# Altium footprint library IC_STD.PcbLib: 32 footprints (part 1 of 2)
Each footprint in its own frame and in the unit in brackets; x right, y up, seen from the top. Pads: shape width x height; smd on the part's side, far side on the other; paste and mask are expansions set on the pad; w line width, h text height; cw(c..) or ccw(c..) is an arc to the next point about the centre after c.
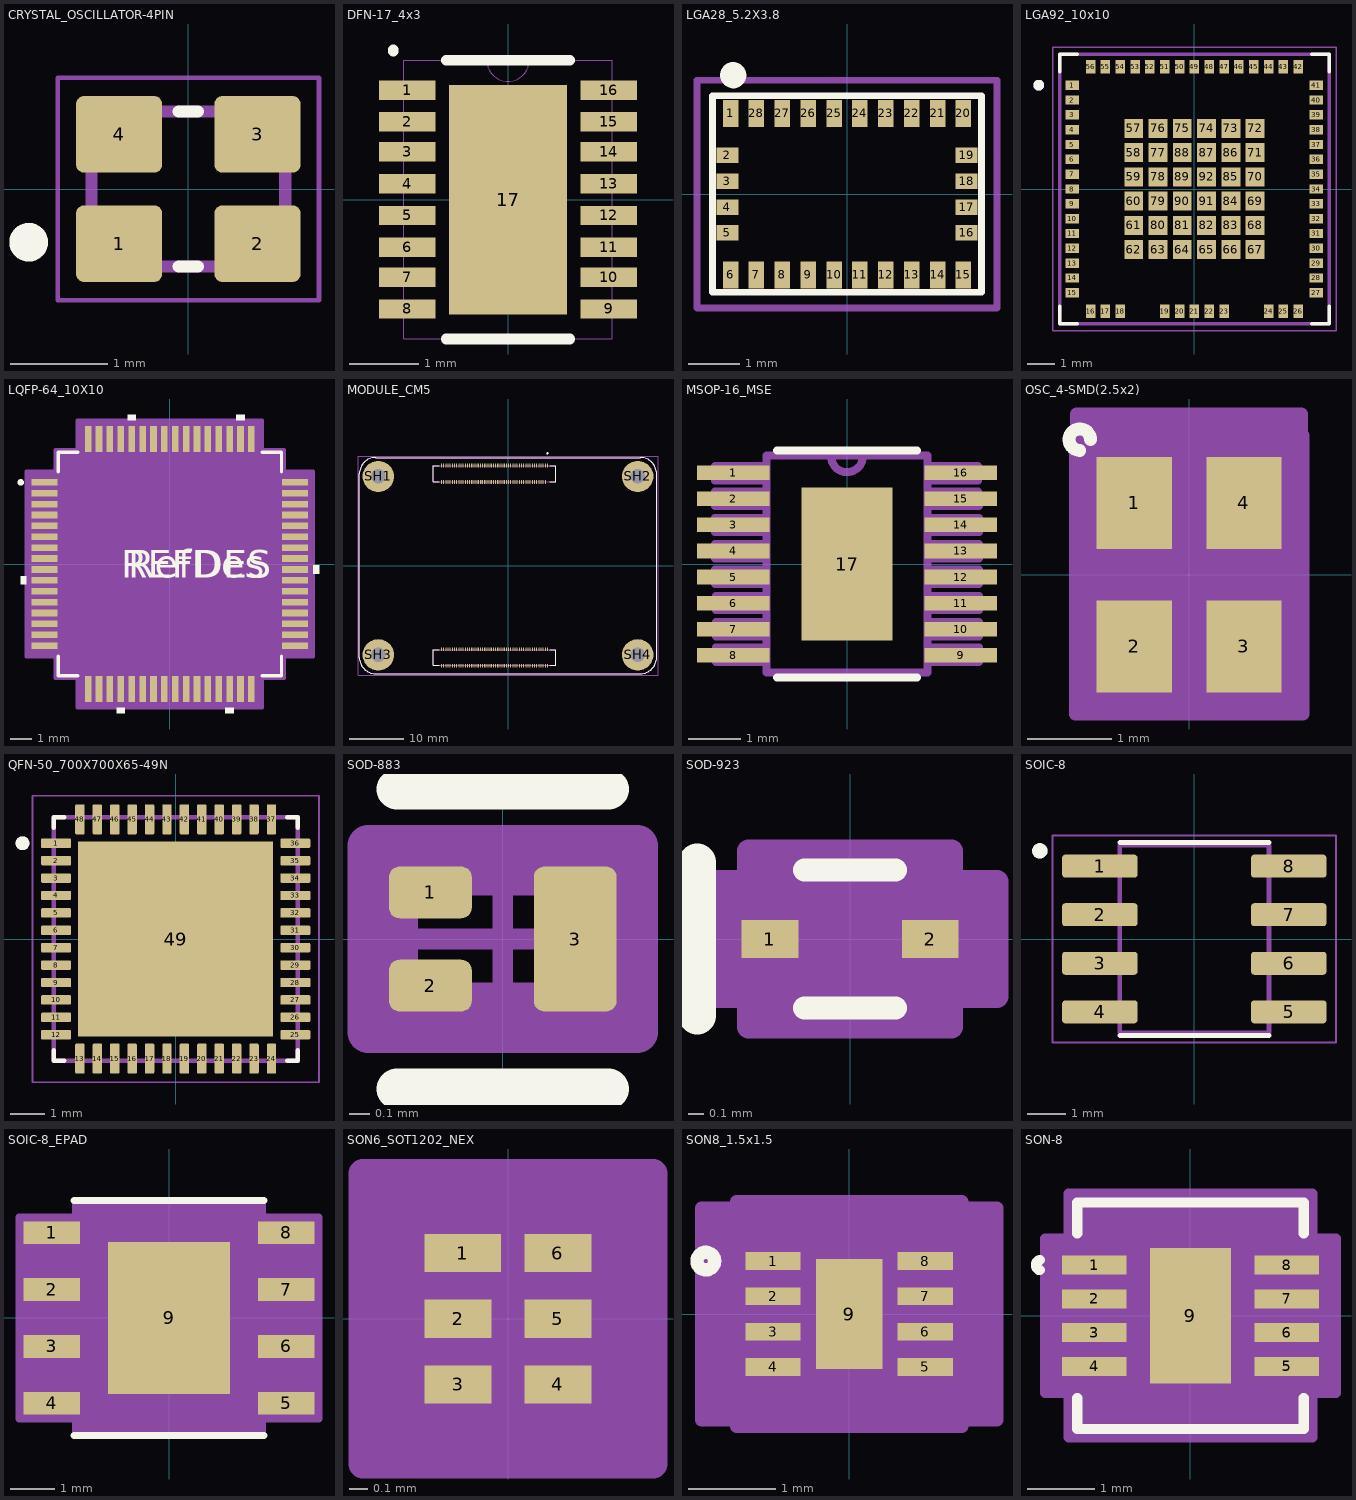
[diagram p0: the footprints below, top view; thin cyan lines are the x and y axes]

## CRYSTAL_OSCILLATOR-4PIN [mm]
pads (4):
  rrect20% 0.89x0.79 smd: 1(-0.715,-0.565) 2(0.715,-0.565) 3(0.715,0.565) 4(-0.715,0.565)
Top Overlay:
  circle w0.2: c-1.65,-0.55 r0.1
  lines w0.127: -0.1,-0.8 0.1,-0.8 ; -0.1,0.8 0.1,0.8
Mechanical 13:
  circle w0.2: c-0.65,-0.45 r0.1
  lines w0.127: -1,-0.8 1,-0.8 1,0.8 -1,0.8 -1,-0.8
Mechanical 15:
  lines w0.05: -1.35,-1.15 1.35,-1.15 1.35,1.15 -1.35,1.15 -1.35,-1.15
3D body "step_temp.STEP": height 0.5, standoff 0, extent -1,-0.8 1,0.8

## DFN-17_4x3 [mil]
pads (17):
  rect 32x11 smd: 1(-57,62) 2(-57,44) 3(-57,27) 4(-57,9) 5(-57,-9) 6(-57,-27) 7(-57,-44) 8(-57,-62) 9(57,-62) 10(57,-44) 11(57,-27) 12(57,-9) 13(57,9) 14(57,27) 15(57,44) 16(57,62)
  rect 67x130 smd: 17(0,0)
Top Overlay:
  lines w6: -65,84 -65,85 ; -35,-79 35,-79 ; -35,79 35,79
Mechanical 13:
  lines w0: -12,79 ccw(c0,79) 12,79 ; -12,79 12,79 ; -12,79 -59,79 -59,-79 59,-79 59,79 12,79
3D body "LT3029EDE#PBF.STEP": height 31.5, standoff 0, extent -59.06,-78.74 59.06,78.74

## LGA28_5.2X3.8 [mm]
pads (28):
  rect 0.3x0.525 smd: 1(-2.25,1.562) 6(-2.25,-1.562) 7(-1.75,-1.562) 8(-1.25,-1.562) 9(-0.75,-1.562) 10(-0.25,-1.562) 11(0.25,-1.562) 12(0.75,-1.562) 13(1.25,-1.562) 14(1.75,-1.562) 15(2.25,-1.562) 20(2.25,1.562) 21(1.75,1.562) 22(1.25,1.562) 23(0.75,1.562) 24(0.25,1.562) 25(-0.25,1.562) 26(-0.75,1.562) 27(-1.25,1.562) 28(-1.75,1.562)
  rect 0.425x0.3 smd: 2(-2.312,0.75) 3(-2.312,0.25) 4(-2.312,-0.25) 5(-2.312,-0.75) 16(2.312,-0.75) 17(2.312,-0.25) 18(2.312,0.25) 19(2.312,0.75)
Top Overlay:
  circle w0.305: c-2.2,2.3 r0.1
  lines w0.127: -2.6,-1.9 2.6,-1.9 2.6,1.9 -2.6,1.9 -2.6,-1.9
Mechanical 15:
  lines w0.127: -2.9,-2.2 -2.9,2.2 2.9,2.2 2.9,-2.2 -2.9,-2.2
3D body "BNO055.STEP": height 1.18, standoff 0, extent -2.6,-1.9 2.6,1.9

## LGA92_10x10 [mm]
height 1.878
pads (92):
  rect 0.5x0.35 smd mask+0.025: 1(-4.525,3.85) 2(-4.525,3.3) 3(-4.525,2.75) 4(-4.525,2.2) 5(-4.525,1.65) 6(-4.525,1.1) 7(-4.525,0.55) 8(-4.525,0) 9(-4.525,-0.55) 10(-4.525,-1.1) 11(-4.525,-1.65) 12(-4.525,-2.2) 13(-4.525,-2.75) 14(-4.525,-3.3) 15(-4.525,-3.85) 27(4.525,-3.85) 28(4.525,-3.3) 29(4.525,-2.75) 30(4.525,-2.2) 31(4.525,-1.65) 32(4.525,-1.1) 33(4.525,-0.55) 34(4.525,0) 35(4.525,0.55) 36(4.525,1.1) 37(4.525,1.65) 38(4.525,2.2) 39(4.525,2.75) 40(4.525,3.3) 41(4.525,3.85)
  rect 0.35x0.5 smd mask+0.025: 16(-3.85,-4.525) 17(-3.3,-4.525) 18(-2.75,-4.525) 19(-1.1,-4.525) 20(-0.55,-4.525) 21(0,-4.525) 22(0.55,-4.525) 23(1.1,-4.525) 24(2.75,-4.525) 25(3.3,-4.525) 26(3.85,-4.525) 42(3.85,4.525) 43(3.3,4.525) 44(2.75,4.525) 45(2.2,4.525) 46(1.65,4.525) 47(1.1,4.525) 48(0.55,4.525) 49(0,4.525) 50(-0.55,4.525) 51(-1.1,4.525) 52(-1.65,4.525) 53(-2.2,4.525) 54(-2.75,4.525) 55(-3.3,4.525) 56(-3.85,4.525)
  rect 0.7x0.7 smd mask+0.025: 57(-2.25,2.25) 58(-2.25,1.35) 59(-2.25,0.45) 60(-2.25,-0.45) 61(-2.25,-1.35) 62(-2.25,-2.25) 63(-1.35,-2.25) 64(-0.45,-2.25) 65(0.45,-2.25) 66(1.35,-2.25) 67(2.25,-2.25) 68(2.25,-1.35) 69(2.25,-0.45) 70(2.25,0.45) 71(2.25,1.35) 72(2.25,2.25) 73(1.35,2.25) 74(0.45,2.25) 75(-0.45,2.25) 76(-1.35,2.25) 77(-1.35,1.35) 78(-1.35,0.45) 79(-1.35,-0.45) 80(-1.35,-1.35) 81(-0.45,-1.35) 82(0.45,-1.35) 83(1.35,-1.35) 84(1.35,-0.45) 85(1.35,0.45) 86(1.35,1.35) 87(0.45,1.35) 88(-0.45,1.35) 89(-0.45,0.45) 90(-0.45,-0.45) 91(0.45,-0.45) 92(0.45,0.45)
Top Overlay:
  circle w0.2: c-5.775,3.85 r0.1
  lines w0.127: -5,-4.345 -5,-5 -4.345,-5 ; -5,4.345 -5,5 -4.345,5 ; 4.345,-5 5,-5 5,-4.345 ; 4.345,5 5,5 5,4.345
Mechanical 13:
  circle w0.2: c-5.775,3.85 r0.1
  lines w0.127: -5,-5 5,-5 5,5 -5,5 -5,-5
Mechanical 15:
  lines w0.05: -5.25,-5.25 5.25,-5.25 5.25,5.25 -5.25,5.25 -5.25,-5.25
3D body "step_temp.STEP": height 1.88, standoff 0, extent -5,-5 5,5

## LQFP-64_10X10 [mm]
pads (64):
  rect 1.194x0.305 smd paste+0 mask+0: 1(-5.75,3.75) 2(-5.75,3.25) 3(-5.75,2.75) 4(-5.75,2.25) 5(-5.75,1.75) 6(-5.75,1.25) 7(-5.75,0.75) 8(-5.75,0.25) 9(-5.75,-0.25) 10(-5.75,-0.75) 11(-5.75,-1.25) 12(-5.75,-1.75) 13(-5.75,-2.25) 14(-5.75,-2.75) 15(-5.75,-3.25) 16(-5.75,-3.75) 33(5.75,-3.75) 34(5.75,-3.25) 35(5.75,-2.75) 36(5.75,-2.25) 37(5.75,-1.75) 38(5.75,-1.25) 39(5.75,-0.75) 40(5.75,-0.25) 41(5.75,0.25) 42(5.75,0.75) 43(5.75,1.25) 44(5.75,1.75) 45(5.75,2.25) 46(5.75,2.75) 47(5.75,3.25) 48(5.75,3.75)
  rect 0.305x1.194 smd paste+0 mask+0: 17(-3.75,-5.75) 18(-3.25,-5.75) 19(-2.75,-5.75) 20(-2.25,-5.75) 21(-1.75,-5.75) 22(-1.25,-5.75) 23(-0.75,-5.75) 24(-0.25,-5.75) 25(0.25,-5.75) 26(0.75,-5.75) 27(1.25,-5.75) 28(1.75,-5.75) 29(2.25,-5.75) 30(2.75,-5.75) 31(3.25,-5.75) 32(3.75,-5.75) 49(3.75,5.75) 50(3.25,5.75) 51(2.75,5.75) 52(2.25,5.75) 53(1.75,5.75) 54(1.25,5.75) 55(0.75,5.75) 56(0.25,5.75) 57(-0.25,5.75) 58(-0.75,5.75) 59(-1.25,5.75) 60(-1.75,5.75) 61(-2.25,5.75) 62(-2.75,5.75) 63(-3.25,5.75) 64(-3.75,5.75)
Top Overlay:
  circle w0.152: c-6.851,3.75 r0.076
  region: -1.559,6.601 -1.94,6.601 -1.94,6.855 -1.559,6.855
  region: 3.441,6.601 3.06,6.601 3.06,6.855 3.441,6.855
  region: 6.601,-0.059 6.855,-0.059 6.855,-0.44 6.601,-0.44
  region: 2.94,-6.601 2.559,-6.601 2.559,-6.855 2.94,-6.855
  region: -2.06,-6.601 -2.441,-6.601 -2.441,-6.855 -2.06,-6.855
  region: -6.601,-0.56 -6.855,-0.56 -6.855,-0.941 -6.601,-0.941
  lines w0.152: -5.131,-4.234 -5.131,-5.131 -4.234,-5.131 ; -5.131,4.234 -5.131,5.131 -4.234,5.131 ; 4.234,-5.131 5.131,-5.131 5.131,-4.234 ; 4.234,5.131 5.131,5.131 5.131,4.234
  text "REFDES" at -2.222,-0.635 h1.27
  text "RefDes" at -1.905,-0.635 h1.27
Mechanical 13:
  circle w0: c-4.518,3.75 r0.076
  lines w0.025: -5.004,3.734 -3.734,5.004 ; -5.004,-5.004 -5.004,5.004 5.004,5.004 5.004,-5.004 -5.004,-5.004
  text "RefDes2" at -2.222,-0.635 h1.27
Mechanical 15:
  region: -4.258,-5.258 -5.258,-5.258 -5.258,-4.258 -6.601,-4.258 -6.601,4.258 -5.258,4.258 -5.258,5.258 -4.258,5.258 -4.258,6.601 4.258,6.601 4.258,5.258 5.258,5.258 5.258,4.258 6.601,4.258 6.601,-4.258 5.258,-4.258 5.258,-5.258 4.258,-5.258 4.258,-6.601 -4.258,-6.601
  lines w0.152: -6.601,-4.258 -6.601,4.258 -5.258,4.258 -5.258,5.258 -4.258,5.258 -4.258,6.601 4.258,6.601 4.258,5.258 5.258,5.258 5.258,4.258 6.601,4.258 6.601,-4.258 5.258,-4.258 5.258,-5.258 4.258,-5.258 4.258,-6.601 -4.258,-6.601 -4.258,-5.258 -5.258,-5.258 -5.258,-4.258 -6.601,-4.258
3D body "LQFP64-10x10mm_STM.step": height 1.6, standoff 0, extent -5.997,-5.997 5.997,5.997

## MODULE_CM5 [mm] "Raspberry Pi CM5 Footprint"
height 5.188
pads (204):
  rect 0.2x0.7 smd: 1(7.3,18.54) 2(-5,15.46) 3(6.9,18.54) 4(6.9,15.46) 5(6.5,18.54) 6(6.5,15.46) 7(6.1,18.54) 8(6.1,15.46) 9(5.7,18.54) 10(5.7,15.46) 11(5.3,18.54) 12(5.3,15.46) 13(4.9,18.54) 14(4.9,15.46) 15(4.5,18.54) 16(4.5,15.46) 17(4.1,18.54) 18(4.1,15.46) 19(3.7,18.54) 20(3.7,15.46) 21(3.3,18.54) 22(3.3,15.46) 23(2.9,18.54) 24(2.9,15.46) 25(2.5,18.54) 26(2.5,15.46) 27(2.1,18.54) 28(2.1,15.46) 29(1.7,18.54) 30(1.7,15.46) 31(1.3,18.54) 32(1.3,15.46) 33(0.9,18.54) 34(0.9,15.46) 35(0.5,18.54) 36(0.5,15.46) 37(0.1,18.54) 38(0.1,15.46) 39(-0.3,18.54) 40(-0.3,15.46) 41(-0.7,18.54) 42(-0.7,15.46) 43(-1.1,18.54) 44(-1.1,15.46) 45(-1.5,18.54) 46(-1.5,15.46) 47(-1.9,18.54) 48(-1.9,15.46) 49(-2.3,18.54) 50(-2.3,15.46) 51(-2.7,18.54) 52(-2.7,15.46) 53(-3.1,18.54) 54(-3.1,15.46) 55(-3.5,18.54) 56(-3.5,15.46) 57(-3.9,18.54) 58(-3.9,15.46) 59(-4.3,18.54) 60(-4.3,15.46) 61(-4.7,18.54) 62(-4.7,15.46) 63(-5.1,18.54) 64(-5.1,15.46) 65(-5.5,18.54) 66(-5.5,15.46) 67(-5.9,18.54) 68(-5.9,15.46) 69(-6.3,18.54) 70(-6.3,15.46) 71(-6.7,18.54) 72(-6.7,15.46) 73(-7.1,18.54) 74(-7.1,15.46) 75(-7.5,18.54) 76(-7.5,15.46) 77(-7.9,18.54) 78(-7.9,15.46) 79(-8.3,18.54) 80(-8.3,15.46) 81(-8.7,18.54) 82(-8.7,15.46) 83(-9.1,18.54) 84(-9.1,15.46) 85(-9.5,18.54) 86(-9.5,15.46) 87(-9.9,18.54) 88(-9.9,15.46) 89(-10.3,18.54) 90(-10.3,15.46) 91(-10.7,18.54) 92(-10.7,15.46) 93(-11.1,18.54) 94(-11.1,15.46) 95(-11.5,18.54) 96(-11.5,15.46) 97(-11.9,18.54) 98(-11.9,15.46) 99(-12.3,18.54) 100(-12.3,15.46) 101(7.3,-15.46) 102(7.3,-18.54) 103(6.9,-15.46) 104(6.9,-18.54) 105(6.5,-15.46) 106(6.5,-18.54) 107(6.1,-15.46) 108(6.1,-18.54) 109(5.7,-15.46) 110(5.7,-18.54) 111(5.3,-15.46) 112(5.3,-18.54) 113(4.9,-15.46) 114(4.9,-18.54) 115(4.5,-15.46) 116(4.5,-18.54) 117(4.1,-15.46) 118(4.1,-18.54) 119(3.7,-15.46) 120(3.7,-18.54) 121(3.3,-15.46) 122(3.3,-18.54) 123(2.9,-15.46) 124(2.9,-18.54) 125(2.5,-15.46) 126(2.5,-18.54) 127(2.1,-15.46) 128(2.1,-18.54) 129(1.7,-15.46) 130(1.7,-18.54) 131(1.3,-15.46) 132(1.3,-18.54) 133(0.9,-15.46) 134(0.9,-18.54) 135(0.5,-15.46) 136(0.5,-18.54) 137(0.1,-15.46) 138(0.1,-18.54) 139(-0.3,-15.46) 140(-0.3,-18.54) 141(-0.7,-15.46) 142(-0.7,-18.54) 143(-1.1,-15.46) 144(-1.1,-18.54) 145(-1.5,-15.46) 146(-1.5,-18.54) 147(-1.9,-15.46) 148(-1.9,-18.54) 149(-2.3,-15.46) 150(-2.3,-18.54) 151(-2.7,-15.46) 152(-2.7,-18.54) 153(-3.1,-15.46) 154(-3.1,-18.54) 155(-3.5,-15.46) 156(-3.5,-18.54) 157(-3.9,-15.46) 158(-3.9,-18.54) 159(-4.3,-15.46) 160(-4.3,-18.54) 161(-4.7,-15.46) 162(-4.7,-18.54) 163(-5.1,-15.46) 164(-5.1,-18.54) 165(-5.5,-15.46) 166(-5.5,-18.54) 167(-5.9,-15.46) 168(-5.9,-18.54) 169(-6.3,-15.46) 170(-6.3,-18.54) 171(-6.7,-15.46) 172(-6.7,-18.54) 173(-7.1,-15.46) 174(-7.1,-18.54) 175(-7.5,-15.46) 176(-7.5,-18.54) 177(-7.9,-15.46) 178(-7.9,-18.54) 179(-8.3,-15.46) 180(-8.3,-18.54) 181(-8.7,-15.46) 182(-8.7,-18.54) 183(-9.1,-15.46) 184(-9.1,-18.54) 185(-9.5,-15.46) 186(-9.5,-18.54) 187(-9.9,-15.46) 188(-9.9,-18.54) 189(-10.3,-15.46) 190(-10.3,-18.54) 191(-10.7,-15.46) 192(-10.7,-18.54) 193(-11.1,-15.46) 194(-11.1,-18.54) 195(-11.5,-15.46) 196(-11.5,-18.54) 197(-11.9,-15.46) 198(-11.9,-18.54) 199(-12.3,-15.46) 200(-12.3,-18.54)
  round 5.8 hole 2.7: SH1(-24,16.5) SH2(24,16.5) SH3(-24,-16.5) SH4(24,-16.5)
Top Overlay:
  circle w0.2: c7.3,20.75 r0.1
  lines w0.127: -12.72,-18.44 -13.8,-18.44 -13.8,-15.56 -12.72,-15.56 ; -12.72,15.56 -13.8,15.56 -13.8,18.44 -12.72,18.44 ; 7.72,-18.44 8.8,-18.44 8.8,-15.56 7.72,-15.56 ; 7.72,15.56 8.8,15.56 8.8,18.44 7.72,18.44 ; -27.5,-17 ccw(c-24.5,-17) -24.5,-20 24.5,-20 ccw(c24.5,-17) 27.5,-17 27.5,17 ccw(c24.5,17) 24.5,20 -24.5,20 ccw(c-24.5,17) -27.5,17 -27.5,-17
Mechanical 13:
  circle w0.2: c7.3,20.75 r0.1
  lines w0.127: -27.5,-17 ccw(c-24.5,-17) -24.5,-20 24.5,-20 ccw(c24.5,-17) 27.5,-17 27.5,17 ccw(c24.5,17) 24.5,20 -24.5,20 ccw(c-24.5,17) -27.5,17 -27.5,-17 ; -13.8,-18.44 8.8,-18.44 8.8,-15.56 -13.8,-15.56 -13.8,-18.44 ; -13.8,15.56 8.8,15.56 8.8,18.44 -13.8,18.44 -13.8,15.56
  text "101-200" at -2.5,-17 h0.81
  text "1-100" at -2.5,17 h0.81
Mechanical 15:
  lines w0.05: -27.75,-20.25 27.75,-20.25 27.75,20.25 -27.75,20.25 -27.75,-20.25
3D body "10164227-1004a1rlf.stp": height 3.86, standoff -0.04, extent -13.8,15.31 8.8,18.69
3D body "10164227-1004a1rlf.stp": height 3.86, standoff -0.04, extent -13.8,-18.69 8.8,-15.31
3D body "CM5R5-3dsteps.step": height 7.51, standoff 2.89, extent -27.5,-19.95 27.5,20.05

## MSOP-16_MSE [mil]
pads (17):
  rect 55x11 smd: 1(-86,68.95) 2(-86,49.25) 3(-86,29.55) 4(-86,9.85) 5(-86,-9.85) 6(-86,-29.55) 7(-86,-49.25) 8(-86,-68.95) 9(86,-68.95) 10(86,-49.25) 11(86,-29.55) 12(86,-9.85) 13(86,9.85) 14(86,29.55) 15(86,49.25) 16(86,68.95)
  rect 69x116 smd paste-78.74: 17(0,0)
Top Overlay:
  lines w6: -53,-86 53,-86 ; -53,86 53,86
Top Paste:
  region: 30.56,-54.06 -30.56,-54.06 -30.56,-3.94 30.56,-3.94
  region: 30.56,3.94 -30.56,3.94 -30.56,54.06 30.56,54.06
Mechanical 13:
  lines w6: -12,81.08 ccw(c0,81.5) 12,81.92 ; -100,-15 -61,-15 -61,-4 -100,-4 -100,-15 ; -100,4 -61,4 -61,15 -100,15 -100,4 ; -100,24 -61,24 -61,35 -100,35 -100,24 ; -100,44 -61,44 -61,55 -100,55 -100,44 ; -100,63 -61,63 -61,74 -100,74 -100,63 ; -99,-74 -61,-74 -61,-63 -99,-63 -99,-74 ; -99,-55 -61,-55 -61,-44 -99,-44 -99,-55 ; -99,-35 -61,-35 -61,-24 -99,-24 -99,-35 ; -61,-82 -61,82 12,82 61,82 61,-82 -61,-82 ; 61,-74 100,-74 100,-63 61,-63 61,-74 ; 61,-55 100,-55 100,-44 61,-44 61,-55 ; 61,-35 100,-35 100,-24 61,-24 61,-35 ; 61,-15 100,-15 100,-4 61,-4 61,-15 ; 61,4 100,4 100,15 61,15 61,4 ; 61,24 100,24 100,35 61,35 61,24 ; 61,44 100,44 99,55 61,55 61,44 ; 61,63 99,63 99,74 61,74 61,63
3D body "step_temp.STEP": height 43.31, standoff 0, extent -96.46,-79.51 96.46,79.51

## OSC_4-SMD(2.5x2) [mm]
pads (4):
  rect 0.889x1.092 smd paste+0 mask+0: 1(-0.65,0.85) 2(-0.65,-0.85) 3(0.65,-0.85) 4(0.65,0.85)
Top Overlay:
  lines w0.152: -1.295,1.473 cw(c-1.295,1.6) -1.168,1.6
Mechanical 13:
  circle w0: c-0.206,0.85 r0.076
  lines w0: -0.305,1.321 ccw(c0,1.321) 0.305,1.321
  lines w0.025: -1.079,-1.321 -1.079,1.321 1.079,1.321 1.079,-1.321 -1.079,-1.321
Mechanical 15:
  region: -1.333,-1.65 -1.348,-1.65 -1.348,1.65 -1.333,1.65 -1.333,1.904 1.333,1.904 1.333,1.65 1.348,1.65 1.348,-1.65 1.333,-1.65
  lines w0.152: -1.348,-1.65 -1.333,-1.65 1.333,-1.65 1.348,-1.65 1.348,1.65 1.333,1.65 1.333,1.904 -1.333,1.904 -1.333,1.65 -1.348,1.65 -1.348,-1.65
3D body "SG-210STF_EPS.step": height 0.89, standoff 0, extent -1.08,-1.321 1.08,1.321

## QFN-50_700X700X65-49N [mm]
height 0.65
pads (49):
  rrect25% 0.86x0.27 smd mask+0: 1(-3.435,2.75) 2(-3.435,2.25) 3(-3.435,1.75) 4(-3.435,1.25) 5(-3.435,0.75) 6(-3.435,0.25) 7(-3.435,-0.25) 8(-3.435,-0.75) 9(-3.435,-1.25) 10(-3.435,-1.75) 11(-3.435,-2.25) 12(-3.435,-2.75) 25(3.435,-2.75) 26(3.435,-2.25) 27(3.435,-1.75) 28(3.435,-1.25) 29(3.435,-0.75) 30(3.435,-0.25) 31(3.435,0.25) 32(3.435,0.75) 33(3.435,1.25) 34(3.435,1.75) 35(3.435,2.25) 36(3.435,2.75)
  rrect25% 0.27x0.86 smd mask+0: 13(-2.75,-3.435) 14(-2.25,-3.435) 15(-1.75,-3.435) 16(-1.25,-3.435) 17(-0.75,-3.435) 18(-0.25,-3.435) 19(0.25,-3.435) 20(0.75,-3.435) 21(1.25,-3.435) 22(1.75,-3.435) 23(2.25,-3.435) 24(2.75,-3.435) 37(2.75,3.435) 38(2.25,3.435) 39(1.75,3.435) 40(1.25,3.435) 41(0.75,3.435) 42(0.25,3.435) 43(-0.25,3.435) 44(-0.75,3.435) 45(-1.25,3.435) 46(-1.75,3.435) 47(-2.25,3.435) 48(-2.75,3.435)
  rect 5.6x5.6 smd paste-4 mask+0.05: 49(0,0)
Top Overlay:
  circle w0.2: c-4.4,2.75 r0.1
  lines w0.127: -3.5,-3.2 -3.5,-3.5 -3.2,-3.5 ; -3.5,3.2 -3.5,3.5 -3.2,3.5 ; 3.2,-3.5 3.5,-3.5 3.5,-3.2 ; 3.2,3.5 3.5,3.5 3.5,3.2
Top Paste:
  region: -0.515,0.515 -2.285,0.515 -2.285,2.285 -0.515,2.285
  region: 2.285,0.515 0.515,0.515 0.515,2.285 2.285,2.285
  region: -0.515,-2.285 -2.285,-2.285 -2.285,-0.515 -0.515,-0.515
  region: 2.285,-2.285 0.515,-2.285 0.515,-0.515 2.285,-0.515
Top Solder:
  drawing of 48 lines, arcs and shapes, not listed
Mechanical 13:
  circle w0.2: c-4.4,2.75 r0.1
  lines w0.127: -3.5,-3.5 3.5,-3.5 3.5,3.5 -3.5,3.5 -3.5,-3.5
Mechanical 15:
  lines w0.05: -4.115,-4.115 4.115,-4.115 4.115,4.115 -4.115,4.115 -4.115,-4.115
3D body "step_temp.STEP": height 0.6, standoff 0, extent -3.5,-3.5 3.5,3.5

## SOD-883 [mm]
pads (3):
  rrect40% 0.4x0.25 smd paste-1000 mask+0: 1(-0.35,0.225) 2(-0.35,-0.225)
  rrect25% 0.4x0.7 smd paste-1000 mask+0: 3(0.35,0)
Top Overlay:
  lines w0.2: -0.51,-0.725 0.51,-0.725 ; -0.51,0.725 0.51,0.725
Top Paste:
  rectangle: 0.2,-0.3 0.5,0.3
  region: -0.2,0.3 -0.2,0.15 -0.2,0.14 -0.208,0.122 -0.222,0.108 -0.24,0.1 -0.25,0.1 -0.45,0.1 -0.46,0.1 -0.478,0.108 -0.492,0.122 -0.5,0.14 -0.5,0.15 -0.5,0.3 -0.5,0.31 -0.492,0.328 -0.478,0.342 -0.46,0.35 -0.45,0.35 -0.25,0.35 -0.24,0.35 -0.222,0.342 -0.208,0.328 -0.2,0.31
  region: -0.5,-0.15 -0.5,-0.14 -0.492,-0.122 -0.478,-0.108 -0.46,-0.1 -0.45,-0.1 -0.25,-0.1 -0.24,-0.1 -0.222,-0.108 -0.208,-0.122 -0.2,-0.14 -0.2,-0.15 -0.2,-0.3 -0.2,-0.31 -0.208,-0.328 -0.222,-0.342 -0.24,-0.35 -0.25,-0.35 -0.45,-0.35 -0.46,-0.35 -0.478,-0.342 -0.492,-0.328 -0.5,-0.31 -0.5,-0.3
Top 3D Body:
  lines w0.2: -0.51,-0.31 0.51,-0.31 0.51,0.31 -0.51,0.31 -0.51,-0.31
Top Courtyard:
  lines w0.2: -0.65,-0.45 0.65,-0.45 0.65,0.45 -0.65,0.45 -0.65,-0.45
Top Assembly:
  lines w0.2: -0.65,-0.45 0.65,-0.45 0.65,0.45 -0.65,0.45 -0.65,-0.45
  text ".Designator" at 0,0 h1
Top Component Center:
  lines w0.1: -0.5,0 0.5,0 ; 0,-0.5 0,0.5
3D body "Diode_Nexperia_PESD5V0V2BMYL_eec.STEP": height 0.25, standoff 0, extent -0.65,-0.45 0.65,0.45

## SOD-923 [mil]
pads (2):
  rect 14.87x10 smd paste+0 mask+0: 1(-20.94,0) 2(20.94,0)
Top Overlay:
  lines w6: -11.88,-18 11.88,-18 ; -11.88,18 11.88,18
  lines w10: -40,-20 -40,20
Mechanical 13:
  lines w1: -16.5,-6.5 -10,-13 ; -16.5,6.5 -10,13 ; -20.5,-5 -16.5,-5 -16.5,5 -20.5,5 -20.5,-5 ; -16.5,-13 -16.5,13 16.5,13 16.5,-13 -16.5,-13 ; 16.5,-5 20.5,-5 20.5,5 16.5,5 16.5,-5
  text "*" at -19,-25 h50
Mechanical 15:
  region: -26.5,-15 -38.37,-15 -38.37,15 -26.5,15 -26.5,23 26.5,23 26.5,15 38.37,15 38.37,-15 26.5,-15 26.5,-23 -26.5,-23
  lines w6: -38.37,-15 -26.5,-15 -26.5,-23 26.5,-23 26.5,-15 38.37,-15 38.37,15 26.5,15 26.5,23 -26.5,23 -26.5,15 -38.37,15 -38.37,-15
3D body "SOD-923_514AB_ONS.step": height 16.26, standoff 0, extent -20.51,-12.99 20.51,12.99

## SOIC-8 [mm]
pads (8):
  rrect25% 1.97x0.6 smd: 1(-2.47,1.905) 2(-2.47,0.635) 3(-2.47,-0.635) 4(-2.47,-1.905) 5(2.47,-1.905) 6(2.47,-0.635) 7(2.47,0.635) 8(2.47,1.905)
Top Overlay:
  circle w0.2: c-4.04,2.305 r0.1
  lines w0.127: -1.95,-2.525 1.95,-2.525 ; -1.95,2.525 1.95,2.525
Mechanical 13:
  circle w0.2: c-4.04,2.305 r0.1
  lines w0.127: -1.95,-2.452 1.95,-2.452 1.95,2.452 -1.95,2.452 -1.95,-2.452
Mechanical 15:
  lines w0.05: -3.705,-2.702 3.705,-2.702 3.705,2.702 -3.705,2.702 -3.705,-2.702
3D body "step_temp.STEP": height 1.75, standoff 0, extent -3,-2.45 3,2.45

## SOIC-8_EPAD [mil]
pads (9):
  rect 49.5x20 smd paste+0 mask+0: 1(-103.25,75) 2(-103.25,25) 3(-103.25,-25) 4(-103.25,-75) 5(103.25,-75) 6(103.25,-25) 7(103.25,25) 8(103.25,75)
  rect 107x134 smd paste-66.5 mask+0: 9(0,0)
Top Overlay:
  lines w6: -83.5,-103.5 83.5,-103.5 ; -83.5,103.5 83.5,103.5
  text "." at -120,105 h50
Top Paste:
  region: -3.94,63.06 -49.56,63.06 -49.56,3.94 -3.94,3.94
  region: -3.94,-3.94 -49.56,-3.94 -49.56,-63.06 -3.94,-63.06
  region: 49.56,63.06 3.94,63.06 3.94,3.94 49.56,3.94
  region: 49.56,-3.94 3.94,-3.94 3.94,-63.06 49.56,-63.06
Mechanical 13:
  lines w1: -12,98.5 ccw(c0,98.5) 12,98.5 ; -122,-85 -122,-65 -78.5,-65 -78.5,-85 -122,-85 ; -122,-35 -122,-15 -78.5,-15 -78.5,-35 -122,-35 ; -122,15 -122,35 -78.5,35 -78.5,15 -122,15 ; -122,65 -122,85 -78.5,85 -78.5,65 -122,65 ; -78.5,-98.5 78.5,-98.5 78.5,98.5 -78.5,98.5 -78.5,-98.5 ; 78.5,-85 78.5,-65 122,-65 122,-85 78.5,-85 ; 78.5,-35 78.5,-15 122,-15 122,-35 78.5,-35 ; 78.5,15 78.5,35 122,35 122,15 78.5,15 ; 78.5,65 78.5,85 122,85 122,65 78.5,65
  text "*" at -76,45.5 h50
Mechanical 15:
  region: -82.5,-89 -132,-89 -132,89 -82.5,89 -82.5,102.5 82.5,102.5 82.5,89 132,89 132,-89 82.5,-89 82.5,-102.5 -82.5,-102.5
  lines w6: -132,-89 -132,89 -82.5,89 -82.5,102.5 82.5,102.5 82.5,89 132,89 132,-89 82.5,-89 82.5,-102.5 -82.5,-102.5 -82.5,-89 -132,-89
3D body "SOIC8_DDA_TEX.step": height 67.09, standoff 0, extent -122.01,-98.5 122.01,98.5

## SON6_SOT1202_NEX [mil]
pads (6):
  rect 16x8 smd paste+0 mask+0: 1(-9.5,13.78)
  rect 14x8 smd paste+0 mask+0: 2(-10.5,0) 3(-10.5,-13.78) 4(10.5,-13.78) 5(10.5,0) 6(10.5,13.78)
Mechanical 13:
  lines w0: -12,20.5 ccw(c0,20.5) 12,20.5
  lines w1: -20.5,-20.5 -20.5,20.5 20.5,20.5 20.5,-20.5 -20.5,-20.5
Mechanical 15:
  region: -30.5,-27.78 -30.5,27.78 -30.5,30.5 30.5,30.5 30.5,27.78 30.5,-27.78 30.5,-30.5 -30.5,-30.5
  lines w6: -30.5,-30.5 30.5,-30.5 30.5,-27.78 30.5,27.78 30.5,30.5 -30.5,30.5 -30.5,27.78 -30.5,-27.78 -30.5,-30.5
3D body "XSON6_SOT1202_NEX.step": height 14.09, standoff 0, extent -20.51,-20.51 20.51,20.51

## SON8_1.5x1.5 [mil]
pads (9):
  rect 25x8 smd paste+0 mask+0: 1(-34.5,24) 2(-34.5,8) 3(-34.5,-8) 4(-34.5,-24) 5(34.5,-24) 6(34.5,-8) 7(34.5,8) 8(34.5,24)
  rect 30x50 smd paste+0 mask+0: 9(0,0)
Top Overlay:
  circle w6: c-65,24 r4
Mechanical 13:
  circle w0: c-22,24 r3
  lines w0: -12,31 ccw(c0,31) 12,31
  lines w1: -31,-31 31,-31 31,31 -31,31 -31,-31
Mechanical 15:
  region: -51,-48 -67,-48 -67,48 -51,48 -51,51 51,51 51,48 67,48 67,-48 51,-48 51,-51 -51,-51
  lines w6: -67,-48 -67,48 -51,48 -51,51 51,51 51,48 67,48 67,-48 51,-48 51,-51 -51,-51 -51,-48 -67,-48
3D body "SON8_PE42430MLAB-Z_PSM.step": height 22.09, standoff 0, extent -30.98,-30.98 30.98,30.98

## SON-8 [mm]
pads (9):
  rect 0.95x0.28 smd paste-0.14 mask+0: 1(-1.425,0.75) 2(-1.425,0.25) 3(-1.425,-0.25) 4(-1.425,-0.75) 5(1.425,-0.75) 6(1.425,-0.25) 7(1.425,0.25) 8(1.425,0.75)
  rect 1.2x2 smd paste-0.987 mask-0.991: 9(0,0)
Top Layer:
  region: 0,-1
  region: 0,1
Top Overlay:
  lines w0.152: -2.233,0.676 cw(c-2.21,0.75) -2.233,0.824 ; -1.677,-1.223 -1.677,-1.677 1.677,-1.677 1.677,-1.223 ; -1.677,1.223 -1.677,1.677 1.677,1.677 1.677,1.223
Top Paste:
  region: 0.525,-0.494 0.241,-0.494 0.1,-0.635 0.1,-0.925 0.525,-0.925
  region: 0.525,0.294 0.241,0.294 0.1,0.152 0.1,-0.152 0.241,-0.294 0.525,-0.294
  region: 0.525,0.925 0.1,0.925 0.1,0.635 0.241,0.494 0.525,0.494
  region: -0.241,-0.494 -0.525,-0.494 -0.525,-0.925 -0.1,-0.925 -0.1,-0.635
  region: -0.241,0.294 -0.525,0.294 -0.525,-0.294 -0.241,-0.294 -0.1,-0.152 -0.1,0.152
  region: -0.1,0.925 -0.525,0.925 -0.525,0.494 -0.241,0.494 -0.1,0.635
Top Solder:
  region: 0,-1
  region: 0,1
  region: 0.2,-1.064 0.2,1.064 0.663,1.064 0.663,-1.064
  region: -0.663,-1.064 -0.663,1.064 -0.2,1.064 -0.2,-1.064
  region: -0.663,-1.064 -0.663,-0.594 0.663,-0.594 0.663,-1.064
  region: -0.663,-0.194 -0.663,0.194 0.663,0.194 0.663,-0.194
  region: -0.663,0.594 -0.663,1.064 0.663,1.064 0.663,0.594
Mechanical 13:
  circle w0: c-0.95,0.75 r0.076
  lines w0: -0.305,1.55 ccw(c0,1.55) 0.305,1.55
  lines w0.025: -1.55,-1.55 -1.55,1.55 1.55,1.55 1.55,-1.55 -1.55,-1.55
Mechanical 15:
  region: -1.804,-1.144 -2.154,-1.144 -2.154,1.144 -1.804,1.144 -1.804,1.804 1.804,1.804 1.804,1.144 2.154,1.144 2.154,-1.144 1.804,-1.144 1.804,-1.804 -1.804,-1.804
  lines w0.152: -2.154,-1.144 -1.804,-1.144 -1.804,-1.804 1.804,-1.804 1.804,-1.144 2.154,-1.144 2.154,1.144 1.804,1.144 1.804,1.804 -1.804,1.804 -1.804,1.144 -2.154,1.144 -2.154,-1.144
3D body "DRG8_1P2X2P0_TEX.step": height 0.8, standoff 0, extent -1.55,-1.55 1.55,1.55